# Altium footprint library MH_DA_THU_VIEN_16122016.PcbLib: 531 footprints (part 26 of 34)
Each footprint in its own frame and in the unit in brackets; x right, y up, seen from the top. Pads: shape width x height; smd on the part's side, far side on the other; paste and mask are expansions set on the pad; w line width, h text height; cw(c..) or ccw(c..) is an arc to the next point about the centre after c.
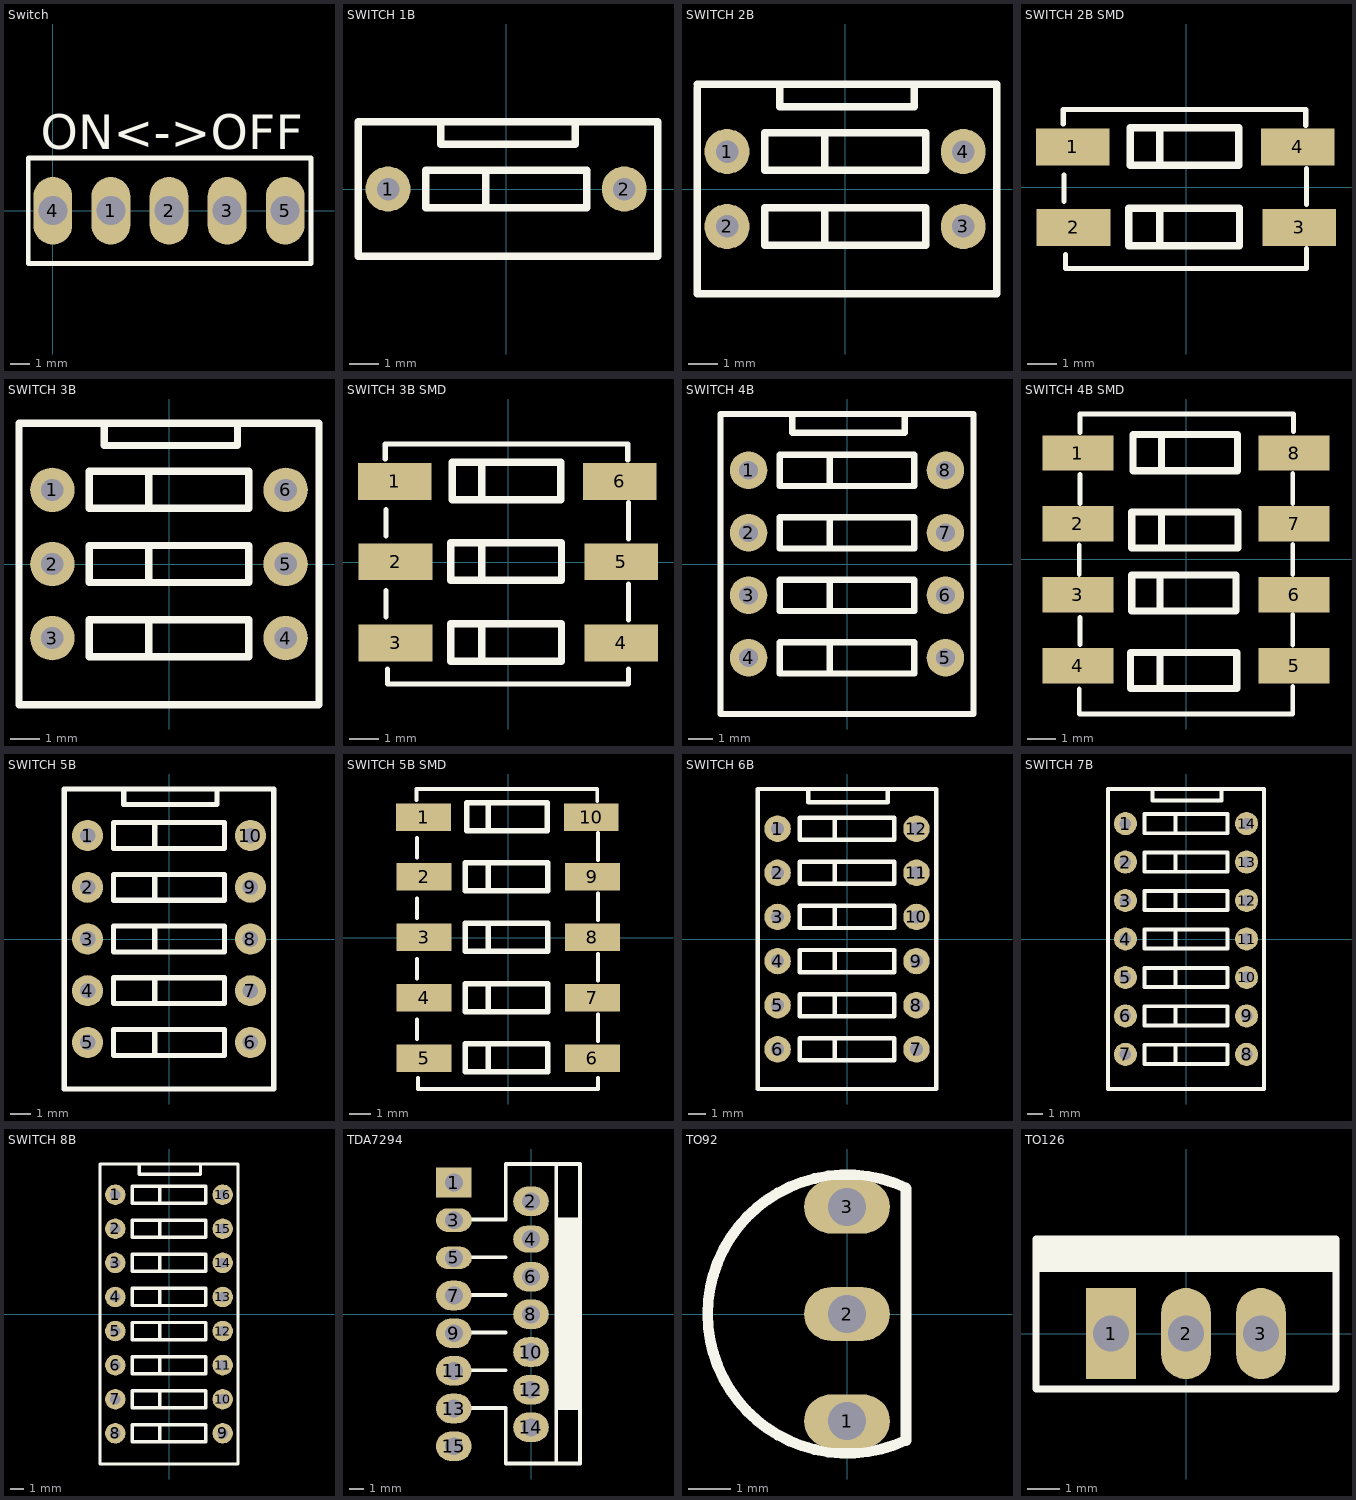
[diagram p25: the footprints below, top view; thin cyan lines are the x and y axes]

## Switch [mm]
pads (5):
  oval 2x3.5 hole 1.5: 1(3,0) 2(6,0) 3(9,0) 4(0,0) 5(12,0)
Top Overlay:
  lines w0.254: -1.27,-2.73 -1.27,2.73 13.335,2.73 13.335,-2.73 -1.27,-2.73
  text "ON<->OFF" at -0.635,3.175 h1.8
3D body: height 2.6, standoff -6, extent -0.5,-2.85 12.5,9.35

## SWITCH 1B [mil]
pads (2):
  round 60 hole 30: 1(-157.5,0) 2(157.5,0)
Top Overlay:
  lines w10: -87.5,85 -87.5,60 92.5,60 92.5,85 ; -27.5,-25 -27.5,25 ; -197.5,-90 202.5,-90 202.5,90 -197.5,90 -197.5,-90 ; -107.5,-25 107.5,-25 107.5,25 -107.5,25 -107.5,-25

## SWITCH 2B [mil]
pads (4):
  round 60 hole 30: 1(-157.5,50) 2(-157.5,-50) 3(157.5,-50) 4(157.5,50)
Top Overlay:
  lines w10: -197.5,135 -197.5,-140 202.5,-140 202.5,140 -197.5,140 ; -87.5,135 -87.5,110 92.5,110 92.5,135 ; -27.5,-75 -27.5,-25 ; -27.5,25 -27.5,70 ; -107.5,-75 107.5,-75 107.5,-25 -107.5,-25 -107.5,-75 ; -107.5,25 -107.5,75 107.5,75 107.5,25 -107.5,25
3D body: height 130.52, standoff -34.83, extent -152.5,-105 147.5,95

## SWITCH 2B SMD [mil]
pads (4):
  rect 100x50 smd: 1(-153.5,54.5) 2(-152.5,-54.5) 3(153.5,-54.5) 4(151.5,54.5)
Top Overlay:
  lines w7: -166.5,105.5 -151.5,105.5 ; -165.5,-19.5 -165.5,16.5 ; -163.5,-110.5 -163.5,-91.5 ; -150.5,105.5 161.5,105.5
  lines w7.01: -166.5,85.5 -166.5,105.5 ; -163.5,-110.5 163.5,-110.5 163.5,-83.5 ; 162.5,83.5 162.5,105.5 ; 163.5,-23.5 163.5,25.5
  lines w10: -35.5,-76.5 -35.5,-31.5 ; -35.5,31.5 -35.5,80.5 -34.5,80.5 ; -77.5,-79.5 72.5,-79.5 72.5,-28.5 -77.5,-28.5 -77.5,-79.5 ; -75.5,29.5 71.5,29.5 71.5,80.5 -75.5,80.5 -75.5,29.5
3D body: height 165.96, standoff 0.6, extent -149.5,-101.5 150.5,98.5

## SWITCH 3B [mil]
pads (6):
  round 60 hole 30: 1(-157.5,100) 2(-157.5,0) 3(-157.5,-100) 4(157.5,-100) 5(157.5,0) 6(157.5,100)
Top Overlay:
  lines w10: -87.5,185 -87.5,160 92.5,160 92.5,185 ; -27.5,-125 -27.5,-75 ; -27.5,-25 -27.5,25 ; -27.5,75 -27.5,120 ; -202.5,-190 202.5,-190 202.5,190 -202.5,190 -202.5,-190 ; -107.5,-125 -107.5,-75 107.5,-75 107.5,-125 -107.5,-125 ; -107.5,-25 107.5,-25 107.5,25 -107.5,25 -107.5,-25 ; -107.5,75 -107.5,125 107.5,125 107.5,75 -107.5,75
3D body: height 165.96, standoff 0.6, extent -152.5,-150 147.5,150

## SWITCH 3B SMD [mil]
pads (6):
  rect 100x50 smd: 1(-153.5,109.5) 2(-152.5,0.5) 3(-152.5,-109.5) 4(153.5,-109.5) 5(153.5,0.5) 6(151.5,109.5)
Top Overlay:
  lines w7: -166.5,160.5 -151.5,160.5 ; -165.5,-74.5 -165.5,-38.5 ; -165.5,35.5 -165.5,71.5 ; -163.5,-165.5 -163.5,-145 ; -150.5,160.5 161.5,160.5
  lines w7.01: -166.5,140 -166.5,160.5 ; -163.5,-165.5 163.5,-165.5 163.5,-145 ; 162.5,138.5 162.5,160.5 ; 163.5,-78.5 163.5,-29.5 ; 163.5,31.5 163.5,80.5
  lines w10: -35.5,-131.5 -35.5,-86.5 ; -35.5,-21.5 -35.5,23.5 ; -35.5,86.5 -35.5,135.5 -34.5,135.5 ; -77.5,-134.5 72.5,-134.5 72.5,-83.5 -77.5,-83.5 -77.5,-134.5 ; -77.5,-24.5 -77.5,26.5 72.5,26.5 72.5,-24.5 -77.5,-24.5 ; -75.5,84.5 -75.5,135.5 71.5,135.5 71.5,84.5 -75.5,84.5
3D body: height 165.96, standoff 0.6, extent -150,-155 150,45
3D body: height 165.96, standoff 0.6, extent -150,-50 150,150

## SWITCH 4B [mil]
pads (8):
  round 60 hole 30: 1(-157.5,150) 2(-157.5,50) 3(-157.5,-50) 4(-157.5,-150) 5(157.5,-150) 6(157.5,-50) 7(157.5,50) 8(157.5,150)
Top Overlay:
  lines w10: -87.5,235 -87.5,210 92.5,210 92.5,235 ; -27.5,-175 -27.5,-125 ; -27.5,-75 -27.5,-25 ; -27.5,25 -27.5,75 ; -27.5,125 -27.5,170 ; -202.5,-240 -202.5,240 202.5,240 202.5,-240 -202.5,-240 ; -107.5,-175 107.5,-175 107.5,-125 -107.5,-125 -107.5,-175 ; -107.5,-75 -107.5,-25 107.5,-25 107.5,-75 -107.5,-75 ; -107.5,25 107.5,25 107.5,75 -107.5,75 -107.5,25 ; -107.5,125 -107.5,175 107.5,175 107.5,125 -107.5,125

## SWITCH 4B SMD [mil]
pads (8):
  rect 100x50 smd: 1(-152.5,149.99) 2(-152.5,50) 3(-152.5,-50) 4(-152.5,-149.99) 5(152.5,-149.99) 6(152.5,-50) 7(152.5,50) 8(152.5,149.99)
Top Overlay:
  lines w7.01: -150.5,-183.01 -150.5,-218.01 150.5,-218.01 150.5,-179.01 ; -150.5,-21.01 -150.5,19.99 ; -149.5,-120.01 -149.5,-82.01 ; -149.5,78.99 -149.5,119.99 ; -149.5,178.99 -149.5,204.99 151.5,204.99 151.5,179.99 ; 150.5,-121.01 150.5,-78.01 ; 150.5,-21.01 150.5,20.99 ; 150.5,78.99 150.5,120.99
  lines w10: -36.5,-179.01 -36.5,-134.01 ; -36.5,-71.01 -36.5,-22.01 -35.5,-22.01 ; -34.5,18.99 -34.5,63.99 ; -34.5,126.99 -34.5,175.99 -33.5,175.99 ; -78.5,-182.01 -78.5,-131.01 71.5,-131.01 71.5,-182.01 -78.5,-182.01 ; -76.5,-73.01 -76.5,-22.01 70.5,-22.01 70.5,-73.01 -76.5,-73.01 ; -76.5,15.99 73.5,15.99 73.5,66.99 -76.5,66.99 -76.5,15.99 ; -74.5,124.99 72.5,124.99 72.5,175.99 -74.5,175.99 -74.5,124.99
3D body: height 165.96, standoff 0.6, extent -149.5,-206.01 150.5,-6.01
3D body: height 165.96, standoff 0.6, extent -149.5,-6.01 150.5,193.99

## SWITCH 5B [mil]
pads (10):
  round 60 hole 30: 1(-157.5,200) 2(-157.5,100) 3(-157.5,0) 4(-157.5,-100) 5(-157.5,-200) 6(157.5,-200) 7(157.5,-100) 8(157.5,0) 9(157.5,100) 10(157.5,200)
Top Overlay:
  lines w10: -87.5,285 -87.5,260 92.5,260 92.5,285 ; -27.5,-225 -27.5,-175 ; -27.5,-125 -27.5,-75 ; -27.5,-25 -27.5,25 ; -27.5,75 -27.5,125 ; -27.5,175 -27.5,220 ; -202.5,-290 202.5,-290 202.5,290 -202.5,290 -202.5,-290 ; -107.5,-225 -107.5,-175 107.5,-175 107.5,-225 -107.5,-225 ; -107.5,-125 -107.5,-75 107.5,-75 107.5,-125 -107.5,-125 ; -107.5,-25 -107.5,25 107.5,25 107.5,-25 -107.5,-25 ; -107.5,75 107.5,75 107.5,125 -107.5,125 -107.5,75 ; -107.5,175 -107.5,225 107.5,225 107.5,175 -107.5,175
3D body: height 130.52, standoff -34.83, extent -147.5,-250 152.5,250

## SWITCH 5B SMD [mil]
pads (10):
  rect 100x50 smd: 1(-153.5,219.5) 2(-152.5,110.5) 3(-152.5,0.5) 4(-152.5,-109.5) 5(-152.5,-219.5) 6(153.5,-219.5) 7(153.5,-109.5) 8(153.5,0.5) 9(153.5,110.5) 10(151.5,219.5)
Top Overlay:
  lines w7: -166.5,270.5 -151.5,270.5 ; -165.5,-184.5 -165.5,-148.5 ; -165.5,-74.5 -165.5,-38.5 ; -165.5,35.5 -165.5,71.5 ; -165.5,145.5 -165.5,181.5 ; -163.5,-275.5 -163.5,-255 ; -150.5,270.5 161.5,270.5
  lines w7.01: -166.5,250 -166.5,270.5 ; -163.5,-275.5 163.5,-275.5 163.5,-255 ; 162.5,248.5 162.5,270.5 ; 163.5,-188.5 163.5,-139.5 ; 163.5,-78.5 163.5,-29.5 ; 163.5,31.5 163.5,80.5 ; 163.5,141.5 163.5,190.5
  lines w10: -35.5,-241.5 -35.5,-196.5 ; -35.5,-131.5 -35.5,-86.5 ; -35.5,-21.5 -35.5,23.5 ; -35.5,88.5 -35.5,133.5 ; -35.5,196.5 -35.5,245.5 -34.5,245.5 ; -77.5,-244.5 -77.5,-193.5 72.5,-193.5 72.5,-244.5 -77.5,-244.5 ; -77.5,-134.5 -77.5,-83.5 72.5,-83.5 72.5,-134.5 -77.5,-134.5 ; -77.5,-24.5 72.5,-24.5 72.5,26.5 -77.5,26.5 -77.5,-24.5 ; -77.5,85.5 -77.5,136.5 72.5,136.5 72.5,85.5 -77.5,85.5 ; -75.5,194.5 -75.5,245.5 71.5,245.5 71.5,194.5 -75.5,194.5
3D body: height 165.96, standoff 0.6, extent -150,54.5 150,254.5
3D body: height 165.96, standoff 0.6, extent -150,-50.5 150,149.5
3D body: height 165.96, standoff 0.6, extent -150,-255 150,-55

## SWITCH 6B [mil]
pads (12):
  round 60 hole 30: 1(-157.5,250) 2(-157.5,150) 3(-157.5,50) 4(-157.5,-50) 5(-157.5,-150) 6(-157.5,-250) 7(157.5,-250) 8(157.5,-150) 9(157.5,-50) 10(157.5,50) 11(157.5,150) 12(157.5,250)
Top Overlay:
  lines w10: -87.5,335 -87.5,310 92.5,310 92.5,335 ; -27.5,-275 -27.5,-225 ; -27.5,-175 -27.5,-125 ; -27.5,-75 -27.5,-25 ; -27.5,25 -27.5,75 ; -27.5,125 -27.5,175 ; -27.5,225 -27.5,270 ; -202.5,-340 -202.5,340 202.5,340 202.5,-340 -202.5,-340 ; -107.5,-275 107.5,-275 107.5,-225 -107.5,-225 -107.5,-275 ; -107.5,-175 -107.5,-125 107.5,-125 107.5,-175 -107.5,-175 ; -107.5,-75 -107.5,-25 107.5,-25 107.5,-75 -107.5,-75 ; -107.5,25 -107.5,75 107.5,75 107.5,25 -107.5,25 ; -107.5,125 107.5,125 107.5,175 -107.5,175 -107.5,125 ; -107.5,225 -107.5,275 107.5,275 107.5,225 -107.5,225

## SWITCH 7B [mil]
pads (14):
  round 60 hole 30: 1(-157.5,300) 2(-157.5,200) 3(-157.5,100) 4(-157.5,0) 5(-157.5,-100) 6(-157.5,-200) 7(-157.5,-300) 8(157.5,-300) 9(157.5,-200) 10(157.5,-100) 11(157.5,0) 12(157.5,100) 13(157.5,200) 14(157.5,300)
Top Overlay:
  lines w10: -87.5,385 -87.5,360 92.5,360 92.5,385 ; -27.5,-325 -27.5,-275 ; -27.5,-225 -27.5,-175 ; -27.5,-125 -27.5,-75 ; -27.5,-25 -27.5,25 ; -27.5,75 -27.5,125 ; -27.5,175 -27.5,225 ; -27.5,275 -27.5,320 ; -202.5,-390 -202.5,390 202.5,390 202.5,-390 -202.5,-390 ; -107.5,-325 -107.5,-275 107.5,-275 107.5,-325 -107.5,-325 ; -107.5,-225 107.5,-225 107.5,-175 -107.5,-175 -107.5,-225 ; -107.5,-125 -107.5,-75 107.5,-75 107.5,-125 -107.5,-125 ; -107.5,-25 -107.5,25 107.5,25 107.5,-25 -107.5,-25 ; -107.5,75 -107.5,125 107.5,125 107.5,75 -107.5,75 ; -107.5,175 107.5,175 107.5,225 -107.5,225 -107.5,175 ; -107.5,275 -107.5,325 107.5,325 107.5,275 -107.5,275

## SWITCH 8B [mil]
pads (16):
  round 60 hole 30: 1(-157.5,350) 2(-157.5,250) 3(-157.5,150) 4(-157.5,50) 5(-157.5,-50) 6(-157.5,-150) 7(-157.5,-250) 8(-157.5,-350) 9(157.5,-350) 10(157.5,-250) 11(157.5,-150) 12(157.5,-50) 13(157.5,50) 14(157.5,150) 15(157.5,250) 16(157.5,350)
Top Overlay:
  lines w10: -87.5,435 -87.5,410 92.5,410 92.5,435 ; -27.5,-375 -27.5,-325 ; -27.5,-275 -27.5,-225 ; -27.5,-175 -27.5,-125 ; -27.5,-75 -27.5,-25 ; -27.5,25 -27.5,75 ; -27.5,125 -27.5,175 ; -27.5,225 -27.5,275 ; -27.5,325 -27.5,370 ; -202.5,-440 -202.5,440 202.5,440 202.5,-440 -202.5,-440 ; -107.5,-375 -107.5,-325 107.5,-325 107.5,-375 -107.5,-375 ; -107.5,-275 107.5,-275 107.5,-225 -107.5,-225 -107.5,-275 ; -107.5,-175 -107.5,-125 107.5,-125 107.5,-175 -107.5,-175 ; -107.5,-75 107.5,-75 107.5,-25 -107.5,-25 -107.5,-75 ; -107.5,25 107.5,25 107.5,75 -107.5,75 -107.5,25 ; -107.5,125 107.5,125 107.5,175 -107.5,175 -107.5,125 ; -107.5,225 -107.5,275 107.5,275 107.5,225 -107.5,225 ; -107.5,325 107.5,325 107.5,375 -107.5,375 -107.5,325

## TDA7294 [mm]
pads (15):
  rect 2.4x2 hole 1.2: 1(-5.219,8.889)
  oval 2.4x2 hole 1.2: 2(-0.019,7.619) 6(-0.019,2.539) 7(-5.219,1.269) 8(-0.019,-0.001) 9(-5.219,-1.271) 10(-0.019,-2.541) 11(-5.219,-3.811) 12(-0.019,-5.081) 13(-5.219,-6.351) 14(-0.019,-7.621) 15(-5.219,-8.891)
  oval 2.4x1.6 hole 1.2: 3(-5.219,6.349)
  oval 2.4x1.8 hole 1.2: 4(-0.019,5.079)
  oval 2.4x1.5 hole 1.2: 5(-5.219,3.809)
Top Overlay:
  rectangle: 1.681,-6.26 3.281,6.389
  lines w0.254: -4.742,-6.311 -1.719,-6.311 ; -4.742,-3.771 -1.719,-3.771 ; -4.742,-1.231 -1.719,-1.231 ; -4.742,1.309 -1.719,1.309 ; -4.742,3.849 -1.719,3.849 ; -4.742,6.389 -1.719,6.389 -1.719,10.139 3.281,10.139 3.281,0.039 3.281,-10.061 -1.719,-10.061 -1.719,-6.311 ; -1.719,-7.682 -1.719,-6.311 ; 1.681,-10.061 1.681,8.625 1.681,10.139 ; 1.681,-6.311 3.281,-6.311 3.281,-8.241 ; 1.681,6.389 3.281,6.389

## TO92 [mm] "TO, Flat Index; 3 In-Line, Axial Leads; Body Dia. 4.8mm"
pads (3):
  oval 2.032x1.27 hole 0.9: 1(0,-2.54) 2(0,0) 3(0,2.54)
Top Overlay:
  lines w0.254: 1.395,-2.993 cw(c0,0) 1.395,2.993 ; 1.397,-2.997 1.397,2.972
3D body: height 8.53, standoff -2.77, extent -2.413,-2.638 1.665,2.892

## TO126 [mil]
pads (3):
  rect 60x110 hole 43.31: 1(-90.55,0)
  oval 60x110 hole 43.31: 2(0,0) 3(90.55,0)
Top Overlay:
  rectangle: -181.1,74.49 181.1,114.17
  lines w7.87: -181.1,-66.93 181.1,-66.93 181.1,114.17 -181.1,114.17 -181.1,-66.93
3D body: height 568.39, standoff -526.1, extent -157.3,-61.72 157.66,66.23